# Altium schematic symbol library jlcpcb_2025_04_capacitors_extended_0603.schlib: 3668 symbols (part 2 of 20) (continued)
## 0603B474K500AT
designator C?  Capacitance: 470nF  (hidden comment: *)
Capacitor, Ceramic (MLCC), 470nF, ±10%, 50V, ±10%, SMD 0603; Manufacturer: FH(Guangdong Fenghua Advanced Tech); Manufacturer Part Number: 0603B474K500AT; Package Size: 0603; JLCPCB Basic Part: No; JLCPCB Part Number: C2857976; Supplier 1: LCSC; Category: Capacitors - MLCC; Supplier Part Number 1: C2857976; Tolerance: ±10%; Voltage Rating: 50V; RoHS: Yes; ComponentLink1Description: Datasheet; ComponentLink2Description: JLCPCB Part URL; ComponentLink2URL: https://jlcpcb.com/partdetail/C2857976; ComponentLink3Description: LCSC Part URL; ComponentLink3URL: https://lcsc.com/product-detail/Multilayer-Ceramic-Capacitors-MLCC---SMD-SMT_FH-Guangdong-Fenghua-Advanced-Tech-FH-Guangdong-Fenghua-Advanced-Tech-0603B474K500AT_C2857976.html
footprint CAP-0603 (0603 (1608M) Capacitor)
pins: 1, 2

## 0603B474K500NT
designator C?  Capacitance: 470nF  (hidden comment: *)
Capacitor, Ceramic (MLCC), 470nF, ±10%, 50V, X7R, ±10%, SMD 0603; Manufacturer: FH(Guangdong Fenghua Advanced Tech); Manufacturer Part Number: 0603B474K500NT; Package Size: 0603; JLCPCB Basic Part: No; JLCPCB Part Number: C77572; Supplier 1: LCSC; Category: Capacitors - MLCC; Supplier Part Number 1: C77572; Tolerance: ±10%; Voltage Rating: 50V; Temperature Coefficient: X7R; RoHS: Yes; ComponentLink1Description: Datasheet; ComponentLink1URL: https://wmsc.lcsc.com/wmsc/upload/file/pdf/v2/lcsc/2304140030_FH--Guangdong-Fenghua-Advanced-Tech-0603B474K500NT_C77572.pdf; ComponentLink2Description: JLCPCB Part URL; ComponentLink2URL: https://jlcpcb.com/partdetail/C77572; ComponentLink3Description: LCSC Part URL; ComponentLink3URL: https://lcsc.com/product-detail/Multilayer-Ceramic-Capacitors-MLCC---SMD-SMT_FH-Guangdong-Fenghua-Advanced-Tech-FH-Guangdong-Fenghua-Advanced-Tech-0603B474K500NT_C77572.html
footprint CAP-0603 (0603 (1608M) Capacitor)
pins: 1, 2

## 0603B474M160NT
designator C?  Capacitance: 470nF  (hidden comment: *)
Capacitor, Ceramic (MLCC), 470nF, ±20%, 16V, X7R, ±20%, SMD 0603; Manufacturer: FH(Guangdong Fenghua Advanced Tech); Manufacturer Part Number: 0603B474M160NT; Package Size: 0603; JLCPCB Basic Part: No; JLCPCB Part Number: C285182; Supplier 1: LCSC; Category: Capacitors - MLCC; Supplier Part Number 1: C285182; Tolerance: ±20%; Voltage Rating: 16V; Temperature Coefficient: X7R; RoHS: Yes; ComponentLink1Description: Datasheet; ComponentLink1URL: https://wmsc.lcsc.com/wmsc/upload/file/pdf/v2/lcsc/2304140030_FH--Guangdong-Fenghua-Advanced-Tech-0603B474M160NT_C285182.pdf; ComponentLink2Description: JLCPCB Part URL; ComponentLink2URL: https://jlcpcb.com/partdetail/C285182; ComponentLink3Description: LCSC Part URL; ComponentLink3URL: https://lcsc.com/product-detail/Multilayer-Ceramic-Capacitors-MLCC---SMD-SMT_FH-Guangdong-Fenghua-Advanced-Tech-FH-Guangdong-Fenghua-Advanced-Tech-0603B474M160NT_C285182.html
footprint CAP-0603 (0603 (1608M) Capacitor)
pins: 1, 2

## 0603B474M250NT
designator C?  Capacitance: 470000pF  (hidden comment: *)
Capacitor, Ceramic (MLCC), 470000pF, ±20%, 25V, X7R, ±20%, SMD 0603; Manufacturer: FH (Guangdong Fenghua Advanced Tech); Manufacturer Part Number: 0603B474M250NT; Package Size: 0603; JLCPCB Basic Part: No; JLCPCB Part Number: C285080; Supplier 1: LCSC; Category: Capacitors - MLCC; Supplier Part Number 1: C285080; Tolerance: ±20%; Voltage Rating: 25V; Temperature Coefficient: X7R; RoHS: Yes; ComponentLink1Description: Datasheet; ComponentLink2Description: JLCPCB Part URL; ComponentLink2URL: https://jlcpcb.com/partdetail/C285080; ComponentLink3Description: LCSC Part URL; ComponentLink3URL: https://lcsc.com/product-detail/Multilayer-Ceramic-Capacitors-MLCC---SMD-SMT_FH-Guangdong-Fenghua-Advanced-Tech-FH-Guangdong-Fenghua-Advanced-Tech-0603B474M250NT_C285080.html
footprint CAP-0603 (0603 (1608M) Capacitor)
pins: 1, 2

## 0603B475K100NT
designator C?  Capacitance: 4.7uF  (hidden comment: *)
Capacitor, Ceramic (MLCC), 4.7uF, ±10%, 10V, X7R, ±10%, SMD 0603; Manufacturer: FH(Guangdong Fenghua Advanced Tech); Manufacturer Part Number: 0603B475K100NT; Package Size: 0603; JLCPCB Basic Part: No; JLCPCB Part Number: C108342; Supplier 1: LCSC; Category: Capacitors - MLCC; Supplier Part Number 1: C108342; Tolerance: ±10%; Voltage Rating: 10V; Temperature Coefficient: X7R; RoHS: Yes; ComponentLink1Description: Datasheet; ComponentLink1URL: https://wmsc.lcsc.com/wmsc/upload/file/pdf/v2/lcsc/2304140030_FH--Guangdong-Fenghua-Advanced-Tech-0603B475K100NT_C108342.pdf; ComponentLink2Description: JLCPCB Part URL; ComponentLink2URL: https://jlcpcb.com/partdetail/C108342; ComponentLink3Description: LCSC Part URL; ComponentLink3URL: https://lcsc.com/product-detail/Multilayer-Ceramic-Capacitors-MLCC---SMD-SMT_FH-Guangdong-Fenghua-Advanced-Tech-FH-Guangdong-Fenghua-Advanced-Tech-0603B475K100NT_C108342.html
footprint CAP-0603 (0603 (1608M) Capacitor)
pins: 1, 2

## 0603B501K500CT
designator C?  Capacitance: 500pF  (hidden comment: *)
Capacitor, Ceramic (MLCC), 500pF, ±10%, 50V, X7R, ±10%, SMD 0603; Manufacturer: Walsin Tech Corp; Manufacturer Part Number: 0603B501K500CT; Package Size: 0603; JLCPCB Basic Part: No; JLCPCB Part Number: C296036; Supplier 1: LCSC; Category: Capacitors - MLCC; Supplier Part Number 1: C296036; Tolerance: ±10%; Voltage Rating: 50V; Temperature Coefficient: X7R; RoHS: Yes; ComponentLink1Description: Datasheet; ComponentLink1URL: https://wmsc.lcsc.com/wmsc/upload/file/pdf/v2/lcsc/2304140030_Walsin-Tech-Corp-0603B501K500CT_C296036.pdf; ComponentLink2Description: JLCPCB Part URL; ComponentLink2URL: https://jlcpcb.com/partdetail/C296036; ComponentLink3Description: LCSC Part URL; ComponentLink3URL: https://lcsc.com/product-detail/Multilayer-Ceramic-Capacitors-MLCC---SMD-SMT_Walsin-Tech-Corp-Walsin-Tech-Corp-0603B501K500CT_C296036.html
footprint CAP-0603 (0603 (1608M) Capacitor)
pins: 1, 2

## 0603B501K500NT
designator C?  Capacitance: 500pF  (hidden comment: *)
Capacitor, Ceramic (MLCC), 500pF, ±10%, 50V, X7R, ±10%, SMD 0603; Manufacturer: FH(Guangdong Fenghua Advanced Tech); Manufacturer Part Number: 0603B501K500NT; Package Size: 0603; JLCPCB Basic Part: No; JLCPCB Part Number: C1624; Supplier 1: LCSC; Category: Capacitors - MLCC; Supplier Part Number 1: C1624; Tolerance: ±10%; Voltage Rating: 50V; Temperature Coefficient: X7R; RoHS: Yes; ComponentLink1Description: Datasheet; ComponentLink1URL: https://wmsc.lcsc.com/wmsc/upload/file/pdf/v2/lcsc/2304140030_FH--Guangdong-Fenghua-Advanced-Tech-0603B501K500NT_C1624.pdf; ComponentLink2Description: JLCPCB Part URL; ComponentLink2URL: https://jlcpcb.com/partdetail/C1624; ComponentLink3Description: LCSC Part URL; ComponentLink3URL: https://lcsc.com/product-detail/Multilayer-Ceramic-Capacitors-MLCC---SMD-SMT_FH-Guangdong-Fenghua-Advanced-Tech-FH-Guangdong-Fenghua-Advanced-Tech-0603B501K500NT_C1624.html
footprint CAP-0603 (0603 (1608M) Capacitor)
pins: 1, 2

## 0603B502K500NT
designator C?  Capacitance: 5nF  (hidden comment: *)
Capacitor, Ceramic (MLCC), 5nF, ±10%, 50V, X7R, ±10%, SMD 0603; Manufacturer: FH(Guangdong Fenghua Advanced Tech); Manufacturer Part Number: 0603B502K500NT; Package Size: 0603; JLCPCB Basic Part: No; JLCPCB Part Number: C1625; Supplier 1: LCSC; Category: Capacitors - MLCC; Supplier Part Number 1: C1625; Tolerance: ±10%; Voltage Rating: 50V; Temperature Coefficient: X7R; RoHS: Yes; ComponentLink1Description: Datasheet; ComponentLink1URL: https://wmsc.lcsc.com/wmsc/upload/file/pdf/v2/lcsc/2304140030_FH--Guangdong-Fenghua-Advanced-Tech-0603B502K500NT_C1625.pdf; ComponentLink2Description: JLCPCB Part URL; ComponentLink2URL: https://jlcpcb.com/partdetail/C1625; ComponentLink3Description: LCSC Part URL; ComponentLink3URL: https://lcsc.com/product-detail/Multilayer-Ceramic-Capacitors-MLCC---SMD-SMT_FH-Guangdong-Fenghua-Advanced-Tech-FH-Guangdong-Fenghua-Advanced-Tech-0603B502K500NT_C1625.html
footprint CAP-0603 (0603 (1608M) Capacitor)
pins: 1, 2

## 0603B511K500NT
designator C?  Capacitance: 510pF  (hidden comment: *)
Capacitor, Ceramic (MLCC), 510pF, ±10%, 50V, X7R, ±10%, SMD 0603; Manufacturer: FH(Guangdong Fenghua Advanced Tech); Manufacturer Part Number: 0603B511K500NT; Package Size: 0603; JLCPCB Basic Part: No; JLCPCB Part Number: C1626; Supplier 1: LCSC; Category: Capacitors - MLCC; Supplier Part Number 1: C1626; Tolerance: ±10%; Voltage Rating: 50V; Temperature Coefficient: X7R; RoHS: Yes; ComponentLink1Description: Datasheet; ComponentLink1URL: https://wmsc.lcsc.com/wmsc/upload/file/pdf/v2/lcsc/2304140030_FH--Guangdong-Fenghua-Advanced-Tech-0603B511K500NT_C1626.pdf; ComponentLink2Description: JLCPCB Part URL; ComponentLink2URL: https://jlcpcb.com/partdetail/C1626; ComponentLink3Description: LCSC Part URL; ComponentLink3URL: https://lcsc.com/product-detail/Multilayer-Ceramic-Capacitors-MLCC---SMD-SMT_FH-Guangdong-Fenghua-Advanced-Tech-FH-Guangdong-Fenghua-Advanced-Tech-0603B511K500NT_C1626.html
footprint CAP-0603 (0603 (1608M) Capacitor)
pins: 1, 2

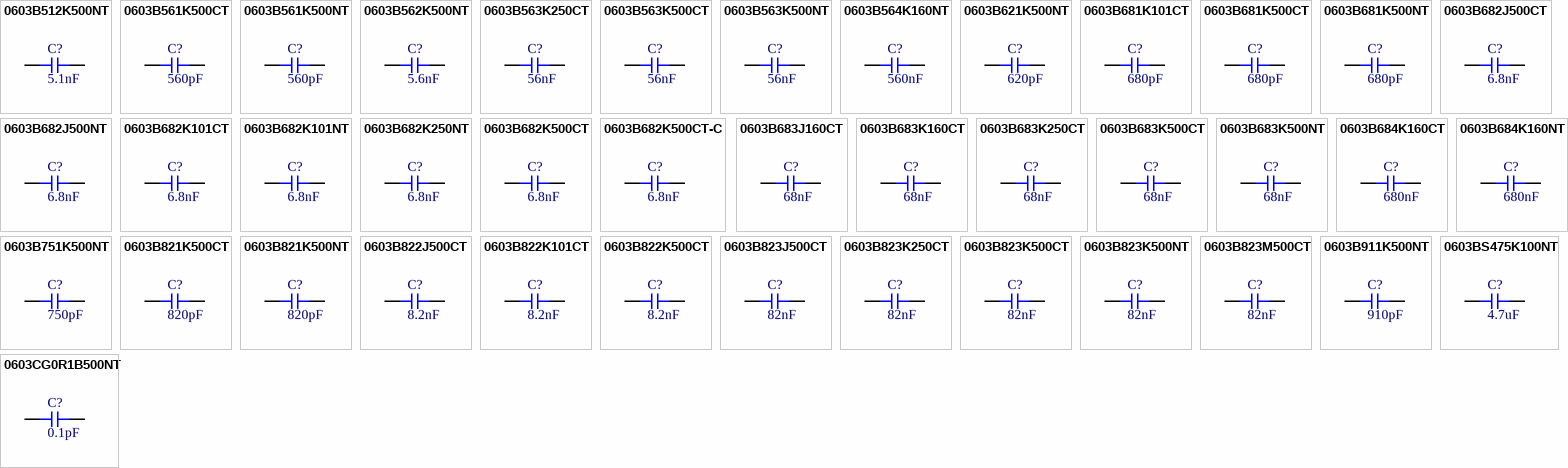
[diagram p7: symbols 0603B512K500NT to 0603CG0R1B500NT]

## 0603B512K500NT
designator C?  Capacitance: 5.1nF  (hidden comment: *)
Capacitor, Ceramic (MLCC), 5.1nF, ±10%, 50V, X7R, ±10%, SMD 0603; Manufacturer: FH(Guangdong Fenghua Advanced Tech); Manufacturer Part Number: 0603B512K500NT; Package Size: 0603; JLCPCB Basic Part: No; JLCPCB Part Number: C1587; Supplier 1: LCSC; Category: Capacitors - MLCC; Supplier Part Number 1: C1587; Tolerance: ±10%; Voltage Rating: 50V; Temperature Coefficient: X7R; RoHS: Yes; ComponentLink1Description: Datasheet; ComponentLink1URL: https://wmsc.lcsc.com/wmsc/upload/file/pdf/v2/lcsc/2304140030_FH--Guangdong-Fenghua-Advanced-Tech-0603B512K500NT_C1587.pdf; ComponentLink2Description: JLCPCB Part URL; ComponentLink2URL: https://jlcpcb.com/partdetail/C1587; ComponentLink3Description: LCSC Part URL; ComponentLink3URL: https://lcsc.com/product-detail/Multilayer-Ceramic-Capacitors-MLCC---SMD-SMT_FH-Guangdong-Fenghua-Advanced-Tech-FH-Guangdong-Fenghua-Advanced-Tech-0603B512K500NT_C1587.html
footprint CAP-0603 (0603 (1608M) Capacitor)
pins: 1, 2

## 0603B561K500CT
designator C?  Capacitance: 560pF  (hidden comment: *)
Capacitor, Ceramic (MLCC), 560pF, ±10%, 50V, X7R, ±10%, SMD 0603; Manufacturer: Walsin Tech Corp; Manufacturer Part Number: 0603B561K500CT; Package Size: 0603; JLCPCB Basic Part: No; JLCPCB Part Number: C237226; Supplier 1: LCSC; Category: Capacitors - MLCC; Supplier Part Number 1: C237226; Tolerance: ±10%; Voltage Rating: 50V; Temperature Coefficient: X7R; RoHS: Yes; ComponentLink1Description: Datasheet; ComponentLink1URL: https://wmsc.lcsc.com/wmsc/upload/file/pdf/v2/lcsc/2304140030_Walsin-Tech-Corp-0603B561K500CT_C237226.pdf; ComponentLink2Description: JLCPCB Part URL; ComponentLink2URL: https://jlcpcb.com/partdetail/C237226; ComponentLink3Description: LCSC Part URL; ComponentLink3URL: https://lcsc.com/product-detail/Multilayer-Ceramic-Capacitors-MLCC---SMD-SMT_Walsin-Tech-Corp-Walsin-Tech-Corp-0603B561K500CT_C237226.html
footprint CAP-0603 (0603 (1608M) Capacitor)
pins: 1, 2

## 0603B561K500NT
designator C?  Capacitance: 560pF  (hidden comment: *)
Capacitor, Ceramic (MLCC), 560pF, ±10%, 50V, X7R, ±10%, SMD 0603; Manufacturer: FH(Guangdong Fenghua Advanced Tech); Manufacturer Part Number: 0603B561K500NT; Package Size: 0603; JLCPCB Basic Part: No; JLCPCB Part Number: C1627; Supplier 1: LCSC; Category: Capacitors - MLCC; Supplier Part Number 1: C1627; Tolerance: ±10%; Voltage Rating: 50V; Temperature Coefficient: X7R; RoHS: Yes; ComponentLink1Description: Datasheet; ComponentLink1URL: https://wmsc.lcsc.com/wmsc/upload/file/pdf/v2/lcsc/2304140030_FH--Guangdong-Fenghua-Advanced-Tech-0603B561K500NT_C1627.pdf; ComponentLink2Description: JLCPCB Part URL; ComponentLink2URL: https://jlcpcb.com/partdetail/C1627; ComponentLink3Description: LCSC Part URL; ComponentLink3URL: https://lcsc.com/product-detail/Multilayer-Ceramic-Capacitors-MLCC---SMD-SMT_FH-Guangdong-Fenghua-Advanced-Tech-FH-Guangdong-Fenghua-Advanced-Tech-0603B561K500NT_C1627.html
footprint CAP-0603 (0603 (1608M) Capacitor)
pins: 1, 2

## 0603B562K500NT
designator C?  Capacitance: 5.6nF  (hidden comment: *)
Capacitor, Ceramic (MLCC), 5.6nF, ±10%, 50V, X7R, ±10%, SMD 0603; Manufacturer: FH(Guangdong Fenghua Advanced Tech); Manufacturer Part Number: 0603B562K500NT; Package Size: 0603; JLCPCB Basic Part: No; JLCPCB Part Number: C1628; Supplier 1: LCSC; Category: Capacitors - MLCC; Supplier Part Number 1: C1628; Tolerance: ±10%; Voltage Rating: 50V; Temperature Coefficient: X7R; RoHS: Yes; ComponentLink1Description: Datasheet; ComponentLink1URL: https://wmsc.lcsc.com/wmsc/upload/file/pdf/v2/lcsc/2304140030_FH--Guangdong-Fenghua-Advanced-Tech-0603B562K500NT_C1628.pdf; ComponentLink2Description: JLCPCB Part URL; ComponentLink2URL: https://jlcpcb.com/partdetail/C1628; ComponentLink3Description: LCSC Part URL; ComponentLink3URL: https://lcsc.com/product-detail/Multilayer-Ceramic-Capacitors-MLCC---SMD-SMT_FH-Guangdong-Fenghua-Advanced-Tech-FH-Guangdong-Fenghua-Advanced-Tech-0603B562K500NT_C1628.html
footprint CAP-0603 (0603 (1608M) Capacitor)
pins: 1, 2

## 0603B563K250CT
designator C?  Capacitance: 56nF  (hidden comment: *)
Capacitor, Ceramic (MLCC), 56nF, ±10%, 25V, X7R, ±10%, SMD 0603; Manufacturer: Walsin Tech Corp; Manufacturer Part Number: 0603B563K250CT; Package Size: 0603; JLCPCB Basic Part: No; JLCPCB Part Number: C314300; Supplier 1: LCSC; Category: Capacitors - MLCC; Supplier Part Number 1: C314300; Tolerance: ±10%; Voltage Rating: 25V; Temperature Coefficient: X7R; RoHS: Yes; ComponentLink1Description: Datasheet; ComponentLink1URL: https://wmsc.lcsc.com/wmsc/upload/file/pdf/v2/lcsc/2304140030_Walsin-Tech-Corp-0603B563K250CT_C314300.pdf; ComponentLink2Description: JLCPCB Part URL; ComponentLink2URL: https://jlcpcb.com/partdetail/C314300; ComponentLink3Description: LCSC Part URL; ComponentLink3URL: https://lcsc.com/product-detail/Multilayer-Ceramic-Capacitors-MLCC---SMD-SMT_Walsin-Tech-Corp-Walsin-Tech-Corp-0603B563K250CT_C314300.html
footprint CAP-0603 (0603 (1608M) Capacitor)
pins: 1, 2

## 0603B563K500CT
designator C?  Capacitance: 56nF  (hidden comment: *)
Capacitor, Ceramic (MLCC), 56nF, ±10%, 50V, X7R, ±10%, SMD 0603; Manufacturer: Walsin Tech Corp; Manufacturer Part Number: 0603B563K500CT; Package Size: 0603; JLCPCB Basic Part: No; JLCPCB Part Number: C152939; Supplier 1: LCSC; Category: Capacitors - MLCC; Supplier Part Number 1: C152939; Tolerance: ±10%; Voltage Rating: 50V; Temperature Coefficient: X7R; RoHS: Yes; ComponentLink1Description: Datasheet; ComponentLink1URL: https://wmsc.lcsc.com/wmsc/upload/file/pdf/v2/lcsc/2304140030_Walsin-Tech-Corp-0603B563K500CT_C152939.pdf; ComponentLink2Description: JLCPCB Part URL; ComponentLink2URL: https://jlcpcb.com/partdetail/C152939; ComponentLink3Description: LCSC Part URL; ComponentLink3URL: https://lcsc.com/product-detail/Multilayer-Ceramic-Capacitors-MLCC---SMD-SMT_Walsin-Tech-Corp-Walsin-Tech-Corp-0603B563K500CT_C152939.html
footprint CAP-0603 (0603 (1608M) Capacitor)
pins: 1, 2

## 0603B563K500NT
designator C?  Capacitance: 56nF  (hidden comment: *)
Capacitor, Ceramic (MLCC), 56nF, ±10%, 50V, X7R, ±10%, SMD 0603; Manufacturer: FH(Guangdong Fenghua Advanced Tech); Manufacturer Part Number: 0603B563K500NT; Package Size: 0603; JLCPCB Basic Part: No; JLCPCB Part Number: C1629; Supplier 1: LCSC; Category: Capacitors - MLCC; Supplier Part Number 1: C1629; Tolerance: ±10%; Voltage Rating: 50V; Temperature Coefficient: X7R; RoHS: Yes; ComponentLink1Description: Datasheet; ComponentLink1URL: https://wmsc.lcsc.com/wmsc/upload/file/pdf/v2/lcsc/2304140030_FH--Guangdong-Fenghua-Advanced-Tech-0603B563K500NT_C1629.pdf; ComponentLink2Description: JLCPCB Part URL; ComponentLink2URL: https://jlcpcb.com/partdetail/C1629; ComponentLink3Description: LCSC Part URL; ComponentLink3URL: https://lcsc.com/product-detail/Multilayer-Ceramic-Capacitors-MLCC---SMD-SMT_FH-Guangdong-Fenghua-Advanced-Tech-FH-Guangdong-Fenghua-Advanced-Tech-0603B563K500NT_C1629.html
footprint CAP-0603 (0603 (1608M) Capacitor)
pins: 1, 2

## 0603B564K160NT
designator C?  Capacitance: 560nF  (hidden comment: *)
Capacitor, Ceramic (MLCC), 560nF, ±10%, 16V, ±10%, SMD 0603; Manufacturer: FH(Guangdong Fenghua Advanced Tech); Manufacturer Part Number: 0603B564K160NT; Package Size: 0603; JLCPCB Basic Part: No; JLCPCB Part Number: C967574; Supplier 1: LCSC; Category: Capacitors - MLCC; Supplier Part Number 1: C967574; Tolerance: ±10%; Voltage Rating: 16V; RoHS: Yes; ComponentLink1Description: Datasheet; ComponentLink1URL: https://wmsc.lcsc.com/wmsc/upload/file/pdf/v2/lcsc/2304140030_FH--Guangdong-Fenghua-Advanced-Tech-0603B564K160NT_C967574.pdf; ComponentLink2Description: JLCPCB Part URL; ComponentLink2URL: https://jlcpcb.com/partdetail/C967574; ComponentLink3Description: LCSC Part URL; ComponentLink3URL: https://lcsc.com/product-detail/Multilayer-Ceramic-Capacitors-MLCC---SMD-SMT_FH-Guangdong-Fenghua-Advanced-Tech-FH-Guangdong-Fenghua-Advanced-Tech-0603B564K160NT_C967574.html
footprint CAP-0603 (0603 (1608M) Capacitor)
pins: 1, 2

## 0603B621K500NT
designator C?  Capacitance: 620pF  (hidden comment: *)
Capacitor, Ceramic (MLCC), 620pF, ±10%, 50V, X7R, ±10%, SMD 0603; Manufacturer: FH (Guangdong Fenghua Advanced Tech); Manufacturer Part Number: 0603B621K500NT; Package Size: 0603; JLCPCB Basic Part: No; JLCPCB Part Number: C2961268; Supplier 1: LCSC; Category: Capacitors - MLCC; Supplier Part Number 1: C2961268; Tolerance: ±10%; Voltage Rating: 50V; Temperature Coefficient: X7R; RoHS: Yes; ComponentLink1Description: Datasheet; ComponentLink1URL: https://wmsc.lcsc.com/wmsc/upload/file/pdf/v2/lcsc/2201211500_FH--Guangdong-Fenghua-Advanced-Tech-0603B621K500NT_C2961268.pdf; ComponentLink2Description: JLCPCB Part URL; ComponentLink2URL: https://jlcpcb.com/partdetail/C2961268; ComponentLink3Description: LCSC Part URL; ComponentLink3URL: https://lcsc.com/product-detail/Multilayer-Ceramic-Capacitors-MLCC---SMD-SMT_FH-Guangdong-Fenghua-Advanced-Tech-FH-Guangdong-Fenghua-Advanced-Tech-0603B621K500NT_C2961268.html
footprint CAP-0603 (0603 (1608M) Capacitor)
pins: 1, 2

## 0603B681K101CT
designator C?  Capacitance: 680pF  (hidden comment: *)
Capacitor, Ceramic (MLCC), 680pF, ±10%, 100V, X7R, ±10%, SMD 0603; Manufacturer: Walsin Tech Corp; Manufacturer Part Number: 0603B681K101CT; Package Size: 0603; JLCPCB Basic Part: No; JLCPCB Part Number: C384779; Supplier 1: LCSC; Category: Capacitors - MLCC; Supplier Part Number 1: C384779; Tolerance: ±10%; Voltage Rating: 100V; Temperature Coefficient: X7R; RoHS: Yes; ComponentLink1Description: Datasheet; ComponentLink1URL: https://wmsc.lcsc.com/wmsc/upload/file/pdf/v2/lcsc/2304140030_Walsin-Tech-Corp-0603B681K101CT_C384779.pdf; ComponentLink2Description: JLCPCB Part URL; ComponentLink2URL: https://jlcpcb.com/partdetail/C384779; ComponentLink3Description: LCSC Part URL; ComponentLink3URL: https://lcsc.com/product-detail/Multilayer-Ceramic-Capacitors-MLCC---SMD-SMT_Walsin-Tech-Corp-Walsin-Tech-Corp-0603B681K101CT_C384779.html
footprint CAP-0603 (0603 (1608M) Capacitor)
pins: 1, 2

## 0603B681K500CT
designator C?  Capacitance: 680pF  (hidden comment: *)
Capacitor, Ceramic (MLCC), 680pF, ±10%, 50V, X7R, ±10%, SMD 0603; Manufacturer: Walsin Tech Corp; Manufacturer Part Number: 0603B681K500CT; Package Size: 0603; JLCPCB Basic Part: No; JLCPCB Part Number: C335547; Supplier 1: LCSC; Category: Capacitors - MLCC; Supplier Part Number 1: C335547; Tolerance: ±10%; Voltage Rating: 50V; Temperature Coefficient: X7R; RoHS: Yes; ComponentLink1Description: Datasheet; ComponentLink1URL: https://wmsc.lcsc.com/wmsc/upload/file/pdf/v2/lcsc/2304140030_Walsin-Tech-Corp-0603B681K500CT_C335547.pdf; ComponentLink2Description: JLCPCB Part URL; ComponentLink2URL: https://jlcpcb.com/partdetail/C335547; ComponentLink3Description: LCSC Part URL; ComponentLink3URL: https://lcsc.com/product-detail/Multilayer-Ceramic-Capacitors-MLCC---SMD-SMT_Walsin-Tech-Corp-Walsin-Tech-Corp-0603B681K500CT_C335547.html
footprint CAP-0603 (0603 (1608M) Capacitor)
pins: 1, 2

## 0603B681K500NT
designator C?  Capacitance: 680pF  (hidden comment: *)
Capacitor, Ceramic (MLCC), 680pF, ±10%, 50V, X7R, ±10%, SMD 0603; Manufacturer: FH(Guangdong Fenghua Advanced Tech); Manufacturer Part Number: 0603B681K500NT; Package Size: 0603; JLCPCB Basic Part: No; JLCPCB Part Number: C1630; Supplier 1: LCSC; Category: Capacitors - MLCC; Supplier Part Number 1: C1630; Tolerance: ±10%; Voltage Rating: 50V; Temperature Coefficient: X7R; RoHS: Yes; ComponentLink1Description: Datasheet; ComponentLink1URL: https://wmsc.lcsc.com/wmsc/upload/file/pdf/v2/lcsc/2304140030_FH--Guangdong-Fenghua-Advanced-Tech-0603B681K500NT_C1630.pdf; ComponentLink2Description: JLCPCB Part URL; ComponentLink2URL: https://jlcpcb.com/partdetail/C1630; ComponentLink3Description: LCSC Part URL; ComponentLink3URL: https://lcsc.com/product-detail/Multilayer-Ceramic-Capacitors-MLCC---SMD-SMT_FH-Guangdong-Fenghua-Advanced-Tech-FH-Guangdong-Fenghua-Advanced-Tech-0603B681K500NT_C1630.html
footprint CAP-0603 (0603 (1608M) Capacitor)
pins: 1, 2

## 0603B682J500CT
designator C?  Capacitance: 6.8nF  (hidden comment: *)
Capacitor, Ceramic (MLCC), 6.8nF, ±5%, 50V, X7R, ±5%, SMD 0603; Manufacturer: Walsin Tech Corp; Manufacturer Part Number: 0603B682J500CT; Package Size: 0603; JLCPCB Basic Part: No; JLCPCB Part Number: C123517; Supplier 1: LCSC; Category: Capacitors - MLCC; Supplier Part Number 1: C123517; Tolerance: ±5%; Voltage Rating: 50V; Temperature Coefficient: X7R; RoHS: Yes; ComponentLink1Description: Datasheet; ComponentLink1URL: https://wmsc.lcsc.com/wmsc/upload/file/pdf/v2/lcsc/2304140030_Walsin-Tech-Corp-0603B682J500CT_C123517.pdf; ComponentLink2Description: JLCPCB Part URL; ComponentLink2URL: https://jlcpcb.com/partdetail/C123517; ComponentLink3Description: LCSC Part URL; ComponentLink3URL: https://lcsc.com/product-detail/Multilayer-Ceramic-Capacitors-MLCC---SMD-SMT_Walsin-Tech-Corp-Walsin-Tech-Corp-0603B682J500CT_C123517.html
footprint CAP-0603 (0603 (1608M) Capacitor)
pins: 1, 2

## 0603B682J500NT
designator C?  Capacitance: 6.8nF  (hidden comment: *)
Capacitor, Ceramic (MLCC), 6.8nF, 50V, X7R, SMD 0603; Manufacturer: FH (Guangdong Fenghua Advanced Tech); Manufacturer Part Number: 0603B682J500NT; Package Size: 0603; JLCPCB Basic Part: No; JLCPCB Part Number: C2939810; Supplier 1: LCSC; Category: Capacitors - MLCC; Supplier Part Number 1: C2939810; Voltage Rating: 50V; Temperature Coefficient: X7R; RoHS: Yes; ComponentLink1Description: Datasheet; ComponentLink1URL: https://wmsc.lcsc.com/wmsc/upload/file/pdf/v2/lcsc/2201121830_FH--Guangdong-Fenghua-Advanced-Tech-0603B682J500NT_C2939810.pdf; ComponentLink2Description: JLCPCB Part URL; ComponentLink2URL: https://jlcpcb.com/partdetail/C2939810; ComponentLink3Description: LCSC Part URL; ComponentLink3URL: https://lcsc.com/product-detail/Multilayer-Ceramic-Capacitors-MLCC---SMD-SMT_FH-Guangdong-Fenghua-Advanced-Tech-FH-Guangdong-Fenghua-Advanced-Tech-0603B682J500NT_C2939810.html
footprint CAP-0603 (0603 (1608M) Capacitor)
pins: 1, 2

## 0603B682K101CT
designator C?  Capacitance: 6.8nF  (hidden comment: *)
Capacitor, Ceramic (MLCC), 6.8nF, ±10%, 100V, X7R, ±10%, SMD 0603; Manufacturer: Walsin Tech Corp; Manufacturer Part Number: 0603B682K101CT; Package Size: 0603; JLCPCB Basic Part: No; JLCPCB Part Number: C152937; Supplier 1: LCSC; Category: Capacitors - MLCC; Supplier Part Number 1: C152937; Tolerance: ±10%; Voltage Rating: 100V; Temperature Coefficient: X7R; RoHS: Yes; ComponentLink1Description: Datasheet; ComponentLink1URL: https://wmsc.lcsc.com/wmsc/upload/file/pdf/v2/lcsc/2304140030_Walsin-Tech-Corp-0603B682K101CT_C152937.pdf; ComponentLink2Description: JLCPCB Part URL; ComponentLink2URL: https://jlcpcb.com/partdetail/C152937; ComponentLink3Description: LCSC Part URL; ComponentLink3URL: https://lcsc.com/product-detail/Multilayer-Ceramic-Capacitors-MLCC---SMD-SMT_Walsin-Tech-Corp-Walsin-Tech-Corp-0603B682K101CT_C152937.html
footprint CAP-0603 (0603 (1608M) Capacitor)
pins: 1, 2

## 0603B682K101NT
designator C?  Capacitance: 6.8nF  (hidden comment: *)
Capacitor, Ceramic (MLCC), 6.8nF, ±10%, 100V, X7R, ±10%, SMD 0603; Manufacturer: FH (Guangdong Fenghua Advanced Tech); Manufacturer Part Number: 0603B682K101NT; Package Size: 0603; JLCPCB Basic Part: No; JLCPCB Part Number: C81355; Supplier 1: LCSC; Category: Capacitors - MLCC; Supplier Part Number 1: C81355; Tolerance: ±10%; Voltage Rating: 100V; Temperature Coefficient: X7R; RoHS: Yes; ComponentLink1Description: Datasheet; ComponentLink1URL: https://wmsc.lcsc.com/wmsc/upload/file/pdf/v2/lcsc/2304140030_FH--Guangdong-Fenghua-Advanced-Tech-0603B682K101NT_C81355.pdf; ComponentLink2Description: JLCPCB Part URL; ComponentLink2URL: https://jlcpcb.com/partdetail/C81355; ComponentLink3Description: LCSC Part URL; ComponentLink3URL: https://lcsc.com/product-detail/Multilayer-Ceramic-Capacitors-MLCC---SMD-SMT_FH-Guangdong-Fenghua-Advanced-Tech-FH-Guangdong-Fenghua-Advanced-Tech-0603B682K101NT_C81355.html
footprint CAP-0603 (0603 (1608M) Capacitor)
pins: 1, 2

## 0603B682K250NT
designator C?  Capacitance: 6.8nF  (hidden comment: *)
Capacitor, Ceramic (MLCC), 6.8nF, ±10%, 25V, X7R, ±10%, SMD 0603; Manufacturer: FH(Guangdong Fenghua Advanced Tech); Manufacturer Part Number: 0603B682K250NT; Package Size: 0603; JLCPCB Basic Part: No; JLCPCB Part Number: C285125; Supplier 1: LCSC; Category: Capacitors - MLCC; Supplier Part Number 1: C285125; Tolerance: ±10%; Voltage Rating: 25V; Temperature Coefficient: X7R; RoHS: Yes; ComponentLink1Description: Datasheet; ComponentLink1URL: https://wmsc.lcsc.com/wmsc/upload/file/pdf/v2/lcsc/2304140030_FH--Guangdong-Fenghua-Advanced-Tech-0603B682K250NT_C285125.pdf; ComponentLink2Description: JLCPCB Part URL; ComponentLink2URL: https://jlcpcb.com/partdetail/C285125; ComponentLink3Description: LCSC Part URL; ComponentLink3URL: https://lcsc.com/product-detail/Multilayer-Ceramic-Capacitors-MLCC---SMD-SMT_FH-Guangdong-Fenghua-Advanced-Tech-FH-Guangdong-Fenghua-Advanced-Tech-0603B682K250NT_C285125.html
footprint CAP-0603 (0603 (1608M) Capacitor)
pins: 1, 2

## 0603B682K500CT
designator C?  Capacitance: 6.8nF  (hidden comment: *)
Capacitor, Ceramic (MLCC), 6.8nF, ±10%, 50V, X7R, ±10%, SMD 0603; Manufacturer: Walsin Tech Corp; Manufacturer Part Number: 0603B682K500CT; Package Size: 0603; JLCPCB Basic Part: No; JLCPCB Part Number: C123518; Supplier 1: LCSC; Category: Capacitors - MLCC; Supplier Part Number 1: C123518; Tolerance: ±10%; Voltage Rating: 50V; Temperature Coefficient: X7R; RoHS: Yes; ComponentLink1Description: Datasheet; ComponentLink1URL: https://wmsc.lcsc.com/wmsc/upload/file/pdf/v2/lcsc/2304140030_Walsin-Tech-Corp-0603B682K500CT_C123518.pdf; ComponentLink2Description: JLCPCB Part URL; ComponentLink2URL: https://jlcpcb.com/partdetail/C123518; ComponentLink3Description: LCSC Part URL; ComponentLink3URL: https://lcsc.com/product-detail/Multilayer-Ceramic-Capacitors-MLCC---SMD-SMT_Walsin-Tech-Corp-Walsin-Tech-Corp-0603B682K500CT_C123518.html
footprint CAP-0603 (0603 (1608M) Capacitor)
pins: 1, 2

## 0603B682K500CT-C
designator C?  Capacitance: 6.8nF  (hidden comment: *)
Capacitor, Ceramic (MLCC), 6.8nF, ±10%, 50V, X7R, ±10%, SMD 0603; Manufacturer: Walsin Tech Corp; Manufacturer Part Number: 0603B682K500CT-C; Package Size: 0603; JLCPCB Basic Part: No; JLCPCB Part Number: C880826; Supplier 1: LCSC; Category: Capacitors - MLCC; Supplier Part Number 1: C880826; Tolerance: ±10%; Voltage Rating: 50V; Temperature Coefficient: X7R; RoHS: Yes; ComponentLink1Description: Datasheet; ComponentLink2Description: JLCPCB Part URL; ComponentLink2URL: https://jlcpcb.com/partdetail/C880826; ComponentLink3Description: LCSC Part URL; ComponentLink3URL: https://lcsc.com/product-detail/Multilayer-Ceramic-Capacitors-MLCC---SMD-SMT_Walsin-Tech-Corp-Walsin-Tech-Corp-0603B682K500CT-C_C880826.html
footprint CAP-0603 (0603 (1608M) Capacitor)
pins: 1, 2

## 0603B683J160CT
designator C?  Capacitance: 68nF  (hidden comment: *)
Capacitor, Ceramic (MLCC), 68nF, ±5%, 16V, X7R, ±5%, SMD 0603; Manufacturer: Walsin Tech Corp; Manufacturer Part Number: 0603B683J160CT; Package Size: 0603; JLCPCB Basic Part: No; JLCPCB Part Number: C388020; Supplier 1: LCSC; Category: Capacitors - MLCC; Supplier Part Number 1: C388020; Tolerance: ±5%; Voltage Rating: 16V; Temperature Coefficient: X7R; RoHS: Yes; ComponentLink1Description: Datasheet; ComponentLink1URL: https://wmsc.lcsc.com/wmsc/upload/file/pdf/v2/lcsc/2304140030_Walsin-Tech-Corp-0603B683J160CT_C388020.pdf; ComponentLink2Description: JLCPCB Part URL; ComponentLink2URL: https://jlcpcb.com/partdetail/C388020; ComponentLink3Description: LCSC Part URL; ComponentLink3URL: https://lcsc.com/product-detail/Multilayer-Ceramic-Capacitors-MLCC---SMD-SMT_Walsin-Tech-Corp-Walsin-Tech-Corp-0603B683J160CT_C388020.html
footprint CAP-0603 (0603 (1608M) Capacitor)
pins: 1, 2

## 0603B683K160CT
designator C?  Capacitance: 68nF  (hidden comment: *)
Capacitor, Ceramic (MLCC), 68nF, ±10%, 16V, X7R, ±10%, SMD 0603; Manufacturer: Walsin Tech Corp; Manufacturer Part Number: 0603B683K160CT; Package Size: 0603; JLCPCB Basic Part: No; JLCPCB Part Number: C424841; Supplier 1: LCSC; Category: Capacitors - MLCC; Supplier Part Number 1: C424841; Tolerance: ±10%; Voltage Rating: 16V; Temperature Coefficient: X7R; RoHS: Yes; ComponentLink1Description: Datasheet; ComponentLink1URL: https://wmsc.lcsc.com/wmsc/upload/file/pdf/v2/lcsc/2304140030_Walsin-Tech-Corp-0603B683K160CT_C424841.pdf; ComponentLink2Description: JLCPCB Part URL; ComponentLink2URL: https://jlcpcb.com/partdetail/C424841; ComponentLink3Description: LCSC Part URL; ComponentLink3URL: https://lcsc.com/product-detail/Multilayer-Ceramic-Capacitors-MLCC---SMD-SMT_Walsin-Tech-Corp-Walsin-Tech-Corp-0603B683K160CT_C424841.html
footprint CAP-0603 (0603 (1608M) Capacitor)
pins: 1, 2

## 0603B683K250CT
designator C?  Capacitance: 68nF  (hidden comment: *)
Capacitor, Ceramic (MLCC), 68nF, ±10%, 25V, X7R, ±10%, SMD 0603; Manufacturer: Walsin Tech Corp; Manufacturer Part Number: 0603B683K250CT; Package Size: 0603; JLCPCB Basic Part: No; JLCPCB Part Number: C388021; Supplier 1: LCSC; Category: Capacitors - MLCC; Supplier Part Number 1: C388021; Tolerance: ±10%; Voltage Rating: 25V; Temperature Coefficient: X7R; RoHS: Yes; ComponentLink1Description: Datasheet; ComponentLink1URL: https://wmsc.lcsc.com/wmsc/upload/file/pdf/v2/lcsc/2304140030_Walsin-Tech-Corp-0603B683K250CT_C388021.pdf; ComponentLink2Description: JLCPCB Part URL; ComponentLink2URL: https://jlcpcb.com/partdetail/C388021; ComponentLink3Description: LCSC Part URL; ComponentLink3URL: https://lcsc.com/product-detail/Multilayer-Ceramic-Capacitors-MLCC---SMD-SMT_Walsin-Tech-Corp-Walsin-Tech-Corp-0603B683K250CT_C388021.html
footprint CAP-0603 (0603 (1608M) Capacitor)
pins: 1, 2

## 0603B683K500CT
designator C?  Capacitance: 68nF  (hidden comment: *)
Capacitor, Ceramic (MLCC), 68nF, ±10%, 50V, X7R, ±10%, SMD 0603; Manufacturer: Walsin Tech Corp; Manufacturer Part Number: 0603B683K500CT; Package Size: 0603; JLCPCB Basic Part: No; JLCPCB Part Number: C335533; Supplier 1: LCSC; Category: Capacitors - MLCC; Supplier Part Number 1: C335533; Tolerance: ±10%; Voltage Rating: 50V; Temperature Coefficient: X7R; RoHS: Yes; ComponentLink1Description: Datasheet; ComponentLink1URL: https://wmsc.lcsc.com/wmsc/upload/file/pdf/v2/lcsc/2304140030_Walsin-Tech-Corp-0603B683K500CT_C335533.pdf; ComponentLink2Description: JLCPCB Part URL; ComponentLink2URL: https://jlcpcb.com/partdetail/C335533; ComponentLink3Description: LCSC Part URL; ComponentLink3URL: https://lcsc.com/product-detail/Multilayer-Ceramic-Capacitors-MLCC---SMD-SMT_Walsin-Tech-Corp-Walsin-Tech-Corp-0603B683K500CT_C335533.html
footprint CAP-0603 (0603 (1608M) Capacitor)
pins: 1, 2

## 0603B683K500NT
designator C?  Capacitance: 68nF  (hidden comment: *)
Capacitor, Ceramic (MLCC), 68nF, ±10%, 50V, X7R, ±10%, SMD 0603; Manufacturer: FH(Guangdong Fenghua Advanced Tech); Manufacturer Part Number: 0603B683K500NT; Package Size: 0603; JLCPCB Basic Part: No; JLCPCB Part Number: C255725; Supplier 1: LCSC; Category: Capacitors - MLCC; Supplier Part Number 1: C255725; Tolerance: ±10%; Voltage Rating: 50V; Temperature Coefficient: X7R; RoHS: Yes; ComponentLink1Description: Datasheet; ComponentLink1URL: https://wmsc.lcsc.com/wmsc/upload/file/pdf/v2/lcsc/2304140030_FH--Guangdong-Fenghua-Advanced-Tech-0603B683K500NT_C255725.pdf; ComponentLink2Description: JLCPCB Part URL; ComponentLink2URL: https://jlcpcb.com/partdetail/C255725; ComponentLink3Description: LCSC Part URL; ComponentLink3URL: https://lcsc.com/product-detail/Multilayer-Ceramic-Capacitors-MLCC---SMD-SMT_FH-Guangdong-Fenghua-Advanced-Tech-FH-Guangdong-Fenghua-Advanced-Tech-0603B683K500NT_C255725.html
footprint CAP-0603 (0603 (1608M) Capacitor)
pins: 1, 2

## 0603B684K160CT
designator C?  Capacitance: 680nF  (hidden comment: *)
Capacitor, Ceramic (MLCC), 680nF, ±10%, 16V, X7R, ±10%, SMD 0603; Manufacturer: Walsin Tech Corp; Manufacturer Part Number: 0603B684K160CT; Package Size: 0603; JLCPCB Basic Part: No; JLCPCB Part Number: C237234; Supplier 1: LCSC; Category: Capacitors - MLCC; Supplier Part Number 1: C237234; Tolerance: ±10%; Voltage Rating: 16V; Temperature Coefficient: X7R; RoHS: Yes; ComponentLink1Description: Datasheet; ComponentLink1URL: https://wmsc.lcsc.com/wmsc/upload/file/pdf/v2/lcsc/2304140030_Walsin-Tech-Corp-0603B684K160CT_C237234.pdf; ComponentLink2Description: JLCPCB Part URL; ComponentLink2URL: https://jlcpcb.com/partdetail/C237234; ComponentLink3Description: LCSC Part URL; ComponentLink3URL: https://lcsc.com/product-detail/Multilayer-Ceramic-Capacitors-MLCC---SMD-SMT_Walsin-Tech-Corp-Walsin-Tech-Corp-0603B684K160CT_C237234.html
footprint CAP-0603 (0603 (1608M) Capacitor)
pins: 1, 2

## 0603B684K160NT
designator C?  Capacitance: 680nF  (hidden comment: *)
Capacitor, Ceramic (MLCC), 680nF, ±10%, 16V, X7R, ±10%, SMD 0603; Manufacturer: FH(Guangdong Fenghua Advanced Tech); Manufacturer Part Number: 0603B684K160NT; Package Size: 0603; JLCPCB Basic Part: No; JLCPCB Part Number: C24797; Supplier 1: LCSC; Category: Capacitors - MLCC; Supplier Part Number 1: C24797; Tolerance: ±10%; Voltage Rating: 16V; Temperature Coefficient: X7R; RoHS: Yes; ComponentLink1Description: Datasheet; ComponentLink1URL: https://wmsc.lcsc.com/wmsc/upload/file/pdf/v2/lcsc/2304140030_FH--Guangdong-Fenghua-Advanced-Tech-0603B684K160NT_C24797.pdf; ComponentLink2Description: JLCPCB Part URL; ComponentLink2URL: https://jlcpcb.com/partdetail/C24797; ComponentLink3Description: LCSC Part URL; ComponentLink3URL: https://lcsc.com/product-detail/Multilayer-Ceramic-Capacitors-MLCC---SMD-SMT_FH-Guangdong-Fenghua-Advanced-Tech-FH-Guangdong-Fenghua-Advanced-Tech-0603B684K160NT_C24797.html
footprint CAP-0603 (0603 (1608M) Capacitor)
pins: 1, 2

## 0603B751K500NT
designator C?  Capacitance: 750pF  (hidden comment: *)
Capacitor, Ceramic (MLCC), 750pF, ±10%, 50V, X7R, ±10%, SMD 0603; Manufacturer: FH(Guangdong Fenghua Advanced Tech); Manufacturer Part Number: 0603B751K500NT; Package Size: 0603; JLCPCB Basic Part: No; JLCPCB Part Number: C327422; Supplier 1: LCSC; Category: Capacitors - MLCC; Supplier Part Number 1: C327422; Tolerance: ±10%; Voltage Rating: 50V; Temperature Coefficient: X7R; RoHS: Yes; ComponentLink1Description: Datasheet; ComponentLink1URL: https://wmsc.lcsc.com/wmsc/upload/file/pdf/v2/lcsc/2304140030_FH--Guangdong-Fenghua-Advanced-Tech-0603B751K500NT_C327422.pdf; ComponentLink2Description: JLCPCB Part URL; ComponentLink2URL: https://jlcpcb.com/partdetail/C327422; ComponentLink3Description: LCSC Part URL; ComponentLink3URL: https://lcsc.com/product-detail/Multilayer-Ceramic-Capacitors-MLCC---SMD-SMT_FH-Guangdong-Fenghua-Advanced-Tech-FH-Guangdong-Fenghua-Advanced-Tech-0603B751K500NT_C327422.html
footprint CAP-0603 (0603 (1608M) Capacitor)
pins: 1, 2

## 0603B821K500CT
designator C?  Capacitance: 820pF  (hidden comment: *)
Capacitor, Ceramic (MLCC), 820pF, ±10%, 50V, X7R, ±10%, SMD 0603; Manufacturer: Walsin Tech Corp; Manufacturer Part Number: 0603B821K500CT; Package Size: 0603; JLCPCB Basic Part: No; JLCPCB Part Number: C302032; Supplier 1: LCSC; Category: Capacitors - MLCC; Supplier Part Number 1: C302032; Tolerance: ±10%; Voltage Rating: 50V; Temperature Coefficient: X7R; RoHS: Yes; ComponentLink1Description: Datasheet; ComponentLink1URL: https://wmsc.lcsc.com/wmsc/upload/file/pdf/v2/lcsc/2304140030_Walsin-Tech-Corp-0603B821K500CT_C302032.pdf; ComponentLink2Description: JLCPCB Part URL; ComponentLink2URL: https://jlcpcb.com/partdetail/C302032; ComponentLink3Description: LCSC Part URL; ComponentLink3URL: https://lcsc.com/product-detail/Multilayer-Ceramic-Capacitors-MLCC---SMD-SMT_Walsin-Tech-Corp-Walsin-Tech-Corp-0603B821K500CT_C302032.html
footprint CAP-0603 (0603 (1608M) Capacitor)
pins: 1, 2

## 0603B821K500NT
designator C?  Capacitance: 820pF  (hidden comment: *)
Capacitor, Ceramic (MLCC), 820pF, ±10%, 50V, X7R, ±10%, SMD 0603; Manufacturer: FH(Guangdong Fenghua Advanced Tech); Manufacturer Part Number: 0603B821K500NT; Package Size: 0603; JLCPCB Basic Part: No; JLCPCB Part Number: C1632; Supplier 1: LCSC; Category: Capacitors - MLCC; Supplier Part Number 1: C1632; Tolerance: ±10%; Voltage Rating: 50V; Temperature Coefficient: X7R; RoHS: Yes; ComponentLink1Description: Datasheet; ComponentLink1URL: https://wmsc.lcsc.com/wmsc/upload/file/pdf/v2/lcsc/2304140030_FH--Guangdong-Fenghua-Advanced-Tech-0603B821K500NT_C1632.pdf; ComponentLink2Description: JLCPCB Part URL; ComponentLink2URL: https://jlcpcb.com/partdetail/C1632; ComponentLink3Description: LCSC Part URL; ComponentLink3URL: https://lcsc.com/product-detail/Multilayer-Ceramic-Capacitors-MLCC---SMD-SMT_FH-Guangdong-Fenghua-Advanced-Tech-FH-Guangdong-Fenghua-Advanced-Tech-0603B821K500NT_C1632.html
footprint CAP-0603 (0603 (1608M) Capacitor)
pins: 1, 2

## 0603B822J500CT
designator C?  Capacitance: 8.2nF  (hidden comment: *)
Capacitor, Ceramic (MLCC), 8.2nF, ±5%, 50V, X7R, ±5%, SMD 0603; Manufacturer: Walsin Tech Corp; Manufacturer Part Number: 0603B822J500CT; Package Size: 0603; JLCPCB Basic Part: No; JLCPCB Part Number: C458884; Supplier 1: LCSC; Category: Capacitors - MLCC; Supplier Part Number 1: C458884; Tolerance: ±5%; Voltage Rating: 50V; Temperature Coefficient: X7R; RoHS: Yes; ComponentLink1Description: Datasheet; ComponentLink1URL: https://wmsc.lcsc.com/wmsc/upload/file/pdf/v2/lcsc/2304140030_Walsin-Tech-Corp-0603B822J500CT_C458884.pdf; ComponentLink2Description: JLCPCB Part URL; ComponentLink2URL: https://jlcpcb.com/partdetail/C458884; ComponentLink3Description: LCSC Part URL; ComponentLink3URL: https://lcsc.com/product-detail/Multilayer-Ceramic-Capacitors-MLCC---SMD-SMT_Walsin-Tech-Corp-Walsin-Tech-Corp-0603B822J500CT_C458884.html
footprint CAP-0603 (0603 (1608M) Capacitor)
pins: 1, 2

## 0603B822K101CT
designator C?  Capacitance: 8.2nF  (hidden comment: *)
Capacitor, Ceramic (MLCC), 8.2nF, ±10%, 100V, X7R, ±10%, SMD 0603; Manufacturer: Walsin Tech Corp; Manufacturer Part Number: 0603B822K101CT; Package Size: 0603; JLCPCB Basic Part: No; JLCPCB Part Number: C3844100; Supplier 1: LCSC; Category: Capacitors - MLCC; Supplier Part Number 1: C3844100; Tolerance: ±10%; Voltage Rating: 100V; Temperature Coefficient: X7R; RoHS: Yes; ComponentLink1Description: Datasheet; ComponentLink1URL: https://wmsc.lcsc.com/wmsc/upload/file/pdf/v2/lcsc/2309201534_Walsin-Tech-Corp-0603B822K101CT_C3844100.pdf; ComponentLink2Description: JLCPCB Part URL; ComponentLink2URL: https://jlcpcb.com/partdetail/C3844100; ComponentLink3Description: LCSC Part URL; ComponentLink3URL: https://lcsc.com/product-detail/Multilayer-Ceramic-Capacitors-MLCC---SMD-SMT_Walsin-Tech-Corp-Walsin-Tech-Corp-0603B822K101CT_C3844100.html
footprint CAP-0603 (0603 (1608M) Capacitor)
pins: 1, 2

## 0603B822K500CT
designator C?  Capacitance: 8.2nF  (hidden comment: *)
Capacitor, Ceramic (MLCC), 8.2nF, ±10%, 50V, X7R, ±10%, SMD 0603; Manufacturer: Walsin Tech Corp; Manufacturer Part Number: 0603B822K500CT; Package Size: 0603; JLCPCB Basic Part: No; JLCPCB Part Number: C296038; Supplier 1: LCSC; Category: Capacitors - MLCC; Supplier Part Number 1: C296038; Tolerance: ±10%; Voltage Rating: 50V; Temperature Coefficient: X7R; RoHS: Yes; ComponentLink1Description: Datasheet; ComponentLink1URL: https://wmsc.lcsc.com/wmsc/upload/file/pdf/v2/lcsc/2304140030_Walsin-Tech-Corp-0603B822K500CT_C296038.pdf; ComponentLink2Description: JLCPCB Part URL; ComponentLink2URL: https://jlcpcb.com/partdetail/C296038; ComponentLink3Description: LCSC Part URL; ComponentLink3URL: https://lcsc.com/product-detail/Multilayer-Ceramic-Capacitors-MLCC---SMD-SMT_Walsin-Tech-Corp-Walsin-Tech-Corp-0603B822K500CT_C296038.html
footprint CAP-0603 (0603 (1608M) Capacitor)
pins: 1, 2

## 0603B823J500CT
designator C?  Capacitance: 82nF  (hidden comment: *)
Capacitor, Ceramic (MLCC), 82nF, ±5%, 50V, X7R, ±5%, SMD 0603; Manufacturer: Walsin Tech Corp; Manufacturer Part Number: 0603B823J500CT; Package Size: 0603; JLCPCB Basic Part: No; JLCPCB Part Number: C2992622; Supplier 1: LCSC; Category: Capacitors - MLCC; Supplier Part Number 1: C2992622; Tolerance: ±5%; Voltage Rating: 50V; Temperature Coefficient: X7R; RoHS: Yes; ComponentLink1Description: Datasheet; ComponentLink1URL: https://wmsc.lcsc.com/wmsc/upload/file/pdf/v2/lcsc/2204121445_Walsin-Tech-Corp-0603B823J500CT_C2992622.pdf; ComponentLink2Description: JLCPCB Part URL; ComponentLink2URL: https://jlcpcb.com/partdetail/C2992622; ComponentLink3Description: LCSC Part URL; ComponentLink3URL: https://lcsc.com/product-detail/Multilayer-Ceramic-Capacitors-MLCC---SMD-SMT_Walsin-Tech-Corp-Walsin-Tech-Corp-0603B823J500CT_C2992622.html
footprint CAP-0603 (0603 (1608M) Capacitor)
pins: 1, 2

## 0603B823K250CT
designator C?  Capacitance: 82nF  (hidden comment: *)
Capacitor, Ceramic (MLCC), 82nF, ±10%, 25V, X7R, ±10%, SMD 0603; Manufacturer: Walsin Tech Corp; Manufacturer Part Number: 0603B823K250CT; Package Size: 0603; JLCPCB Basic Part: No; JLCPCB Part Number: C388022; Supplier 1: LCSC; Category: Capacitors - MLCC; Supplier Part Number 1: C388022; Tolerance: ±10%; Voltage Rating: 25V; Temperature Coefficient: X7R; RoHS: Yes; ComponentLink1Description: Datasheet; ComponentLink1URL: https://wmsc.lcsc.com/wmsc/upload/file/pdf/v2/lcsc/2304140030_Walsin-Tech-Corp-0603B823K250CT_C388022.pdf; ComponentLink2Description: JLCPCB Part URL; ComponentLink2URL: https://jlcpcb.com/partdetail/C388022; ComponentLink3Description: LCSC Part URL; ComponentLink3URL: https://lcsc.com/product-detail/Multilayer-Ceramic-Capacitors-MLCC---SMD-SMT_Walsin-Tech-Corp-Walsin-Tech-Corp-0603B823K250CT_C388022.html
footprint CAP-0603 (0603 (1608M) Capacitor)
pins: 1, 2

## 0603B823K500CT
designator C?  Capacitance: 82nF  (hidden comment: *)
Capacitor, Ceramic (MLCC), 82nF, ±10%, 50V, X7R, ±10%, SMD 0603; Manufacturer: Walsin Tech Corp; Manufacturer Part Number: 0603B823K500CT; Package Size: 0603; JLCPCB Basic Part: No; JLCPCB Part Number: C296039; Supplier 1: LCSC; Category: Capacitors - MLCC; Supplier Part Number 1: C296039; Tolerance: ±10%; Voltage Rating: 50V; Temperature Coefficient: X7R; RoHS: Yes; ComponentLink1Description: Datasheet; ComponentLink1URL: https://wmsc.lcsc.com/wmsc/upload/file/pdf/v2/lcsc/2304140030_Walsin-Tech-Corp-0603B823K500CT_C296039.pdf; ComponentLink2Description: JLCPCB Part URL; ComponentLink2URL: https://jlcpcb.com/partdetail/C296039; ComponentLink3Description: LCSC Part URL; ComponentLink3URL: https://lcsc.com/product-detail/Multilayer-Ceramic-Capacitors-MLCC---SMD-SMT_Walsin-Tech-Corp-Walsin-Tech-Corp-0603B823K500CT_C296039.html
footprint CAP-0603 (0603 (1608M) Capacitor)
pins: 1, 2

## 0603B823K500NT
designator C?  Capacitance: 82nF  (hidden comment: *)
Capacitor, Ceramic (MLCC), 82nF, ±10%, 50V, X7R, ±10%, SMD 0603; Manufacturer: FH(Guangdong Fenghua Advanced Tech); Manufacturer Part Number: 0603B823K500NT; Package Size: 0603; JLCPCB Basic Part: No; JLCPCB Part Number: C1951; Supplier 1: LCSC; Category: Capacitors - MLCC; Supplier Part Number 1: C1951; Tolerance: ±10%; Voltage Rating: 50V; Temperature Coefficient: X7R; RoHS: Yes; ComponentLink1Description: Datasheet; ComponentLink1URL: https://wmsc.lcsc.com/wmsc/upload/file/pdf/v2/lcsc/2304140030_FH--Guangdong-Fenghua-Advanced-Tech-0603B823K500NT_C1951.pdf; ComponentLink2Description: JLCPCB Part URL; ComponentLink2URL: https://jlcpcb.com/partdetail/C1951; ComponentLink3Description: LCSC Part URL; ComponentLink3URL: https://lcsc.com/product-detail/Multilayer-Ceramic-Capacitors-MLCC---SMD-SMT_FH-Guangdong-Fenghua-Advanced-Tech-FH-Guangdong-Fenghua-Advanced-Tech-0603B823K500NT_C1951.html
footprint CAP-0603 (0603 (1608M) Capacitor)
pins: 1, 2

## 0603B823M500CT
designator C?  Capacitance: 82nF  (hidden comment: *)
Capacitor, Ceramic (MLCC), 82nF, ±20%, 50V, X7R, ±20%, SMD 0603; Manufacturer: Walsin Tech Corp; Manufacturer Part Number: 0603B823M500CT; Package Size: 0603; JLCPCB Basic Part: No; JLCPCB Part Number: C296040; Supplier 1: LCSC; Category: Capacitors - MLCC; Supplier Part Number 1: C296040; Tolerance: ±20%; Voltage Rating: 50V; Temperature Coefficient: X7R; RoHS: Yes; ComponentLink1Description: Datasheet; ComponentLink1URL: https://wmsc.lcsc.com/wmsc/upload/file/pdf/v2/lcsc/2304140030_Walsin-Tech-Corp-0603B823M500CT_C296040.pdf; ComponentLink2Description: JLCPCB Part URL; ComponentLink2URL: https://jlcpcb.com/partdetail/C296040; ComponentLink3Description: LCSC Part URL; ComponentLink3URL: https://lcsc.com/product-detail/Multilayer-Ceramic-Capacitors-MLCC---SMD-SMT_Walsin-Tech-Corp-Walsin-Tech-Corp-0603B823M500CT_C296040.html
footprint CAP-0603 (0603 (1608M) Capacitor)
pins: 1, 2
